# Altium footprint library aiskylab-01Resistors.PcbLib: 208 footprints (part 5 of 13)
Each footprint in its own frame and in the unit in brackets; x right, y up, seen from the top. Pads: shape width x height; smd on the part's side, far side on the other; paste and mask are expansions set on the pad; w line width, h text height; cw(c..) or ccw(c..) is an arc to the next point about the centre after c.
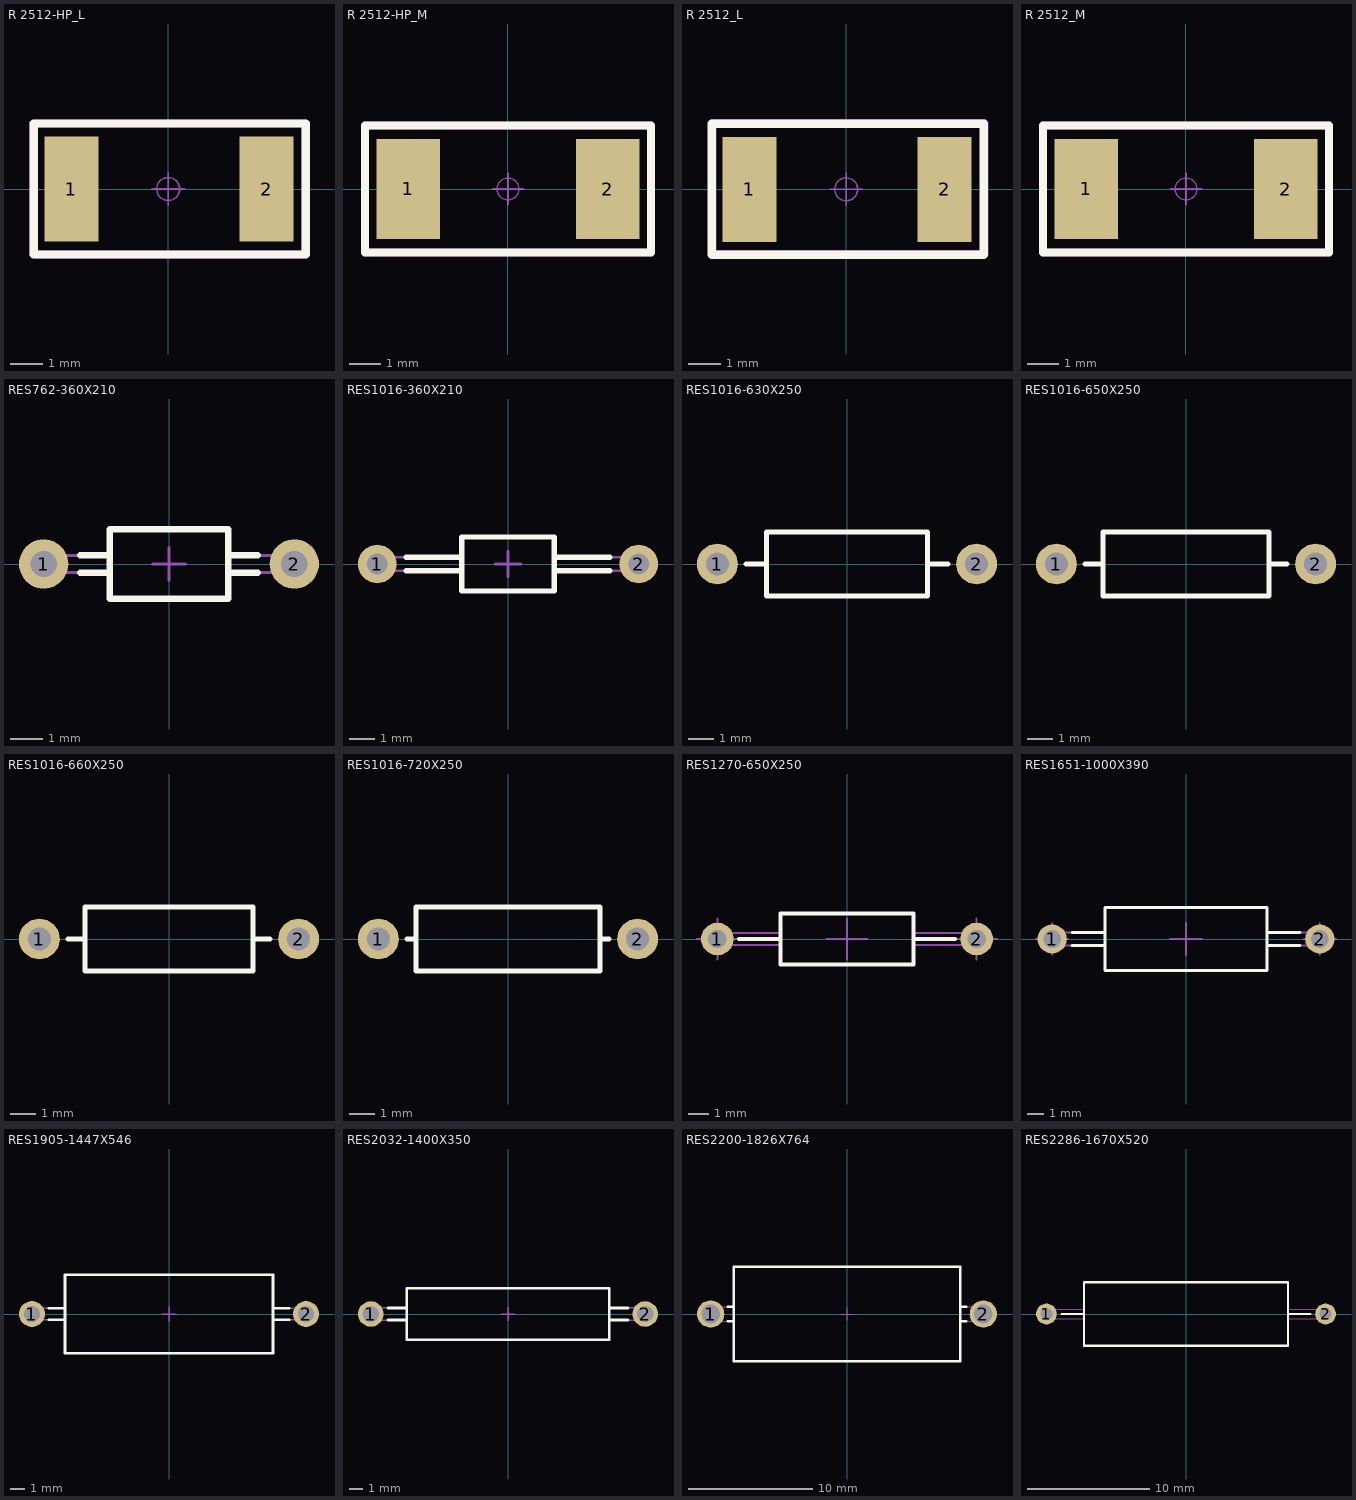
[diagram p4: the footprints below, top view; thin cyan lines are the x and y axes]

## R 2512-HP_L [mm] "2W贴片电阻"
pads (2):
  rect 1.65x3.2 smd: 1(-2.95,0) 2(3,0)
Top Overlay:
  lines w0.254: -4.1,-2 -4.1,2 4.2,2 4.2,-2 -4.1,-2
Top Designator:
  text ".Designator" at -7.568,-0.508 h1.52
Top Assembly:
  lines w0.254: -4.1,-2 -4.1,2 4.2,2 4.2,-2 -4.1,-2
Top Component Center:
  circle w0.05: c0,0 r0.35
  lines w0.05: -0.5,0 0.5,0 ; 0,-0.5 0,0.5
3D body "R 2512-HP.STEP": height 0.55, standoff -0.02, extent -3.2,-1.6 3.2,1.6

## R 2512-HP_M [mm] "2W贴片电阻"
pads (2):
  rect 2.032x3.2 smd: 1(-3.2,0) 2(3.2,0)
Top Overlay:
  lines w0.254: -4.572,-2.032 4.572,-2.032 4.572,2.032 -4.572,2.032 -4.572,-2.032
Top Designator:
  text ".Designator" at -7.618,-0.508 h1.52
Top Assembly:
  lines w0.254: -4.572,-2.032 4.572,-2.032 4.572,2.032 -4.572,2.032 -4.572,-2.032
Top Component Center:
  circle w0.05: c0,0 r0.35
  lines w0.05: -0.5,0 0.5,0 ; 0,-0.5 0,0.5
3D body "R 2512-HP.STEP": height 0.55, standoff -0.02, extent -3.2,-1.6 3.2,1.6

## R 2512_L [mm] "2W贴片电阻"
pads (2):
  rect 1.65x3.2 smd: 1(-2.95,0) 2(3,0)
Top Overlay:
  lines w0.254: -4.1,-2 -4.1,2 4.2,2 4.2,-2 -4.1,-2
Top Designator:
  text ".Designator" at -7.562,-0.498 h1.52
Top Assembly:
  lines w0.254: -4.089,-1.981 -4.089,2.019 4.211,2.019 4.211,-1.981 -4.089,-1.981
Top Component Center:
  circle w0.05: c0,0 r0.35
  lines w0.05: -0.5,0 0.5,0 ; 0,-0.5 0,0.5
3D body "R 2512.STEP": height 0.55, standoff -0.02, extent -3.2,-1.6 3.2,1.6

## R 2512_M [mm] "2W贴片电阻"
pads (2):
  rect 2.032x3.2 smd: 1(-3.2,0) 2(3.2,0)
Top Overlay:
  lines w0.254: -4.572,-2.032 4.572,-2.032 4.572,2.032 -4.572,2.032 -4.572,-2.032
Top Designator:
  text ".Designator" at -7.618,-0.508 h1.52
Top Assembly:
  lines w0.254: -4.572,-2.032 4.572,-2.032 4.572,2.032 -4.572,2.032 -4.572,-2.032
Top Component Center:
  circle w0.05: c0,0 r0.35
  lines w0.05: -0.5,0 0.5,0 ; 0,-0.5 0,0.5
3D body "R 2512.STEP": height 0.55, standoff -0.02, extent -3.2,-1.6 3.2,1.6

## RES762-360X210 [mm] "Resistor, Axial, Pad spacing 7.62mm - Body Lengh 3.6mm X Body Diameter 2.1mm"
height 2.1
pads (2):
  round 1.5 hole 0.8: 1(-3.81,0) 2(3.81,0)
Top Overlay:
  lines w0.2: -2.69,-0.26 -1.8,-0.26 ; -2.69,0.26 -1.8,0.26 ; 1.8,-0.26 2.69,-0.26 ; 1.8,0.26 2.69,0.26 ; -1.8,-1.05 1.8,-1.05 1.8,1.05 -1.8,1.05 -1.8,-1.05
Top Designator:
  text ".Designator" at -7.618,-0.508 h1.52
Top Assembly:
  lines w0.1: -1.8,-0.26 -3.81,-0.26 cw(c-3.81,0) -3.81,0.26 -1.8,0.26 ; 1.8,-0.26 3.81,-0.26 ccw(c3.81,0) 3.81,0.26 1.8,0.26 ; -1.8,-1.05 1.8,-1.05 1.8,1.05 -1.8,1.05 -1.8,-1.05
Top Dimensions:
  lines w0.1: -4.31,0 -3.81,0 ; -3.81,-0.5 -3.81,0 ; -3.81,0.5 -3.81,0 ; -3.31,0 -3.81,0 ; -0.5,0 0,0 ; 0,-0.5 0,0 ; 0,0.5 0,0 ; 0.5,0 0,0 ; 3.31,0 3.81,0 ; 3.81,-0.5 3.81,0 ; 3.81,0.5 3.81,0 ; 4.31,0 3.81,0
3D body "RES762-360X210.stp": height 2.1, standoff -3.6, extent -4.07,-1.05 4.07,1.05
3D body "v150-080.stp": height 0.02, standoff -1.65, extent 3.06,-0.75 4.56,0.75
3D body "v150-080.stp": height 0.02, standoff -1.65, extent -4.56,-0.75 -3.06,0.75

## RES1016-360X210 [mm] "Resistor, Axial, Pad spacing 10.16 mm - Body Lengh 3.6mm X Body Diameter 2.1mm"
height 2.1
pads (2):
  round 1.5 hole 0.8: 1(-5.08,0) 2(5.08,0)
Top Overlay:
  lines w0.2: -3.96,-0.26 -1.8,-0.26 ; -3.96,0.26 -1.8,0.26 ; 1.8,-0.26 3.96,-0.26 ; 1.8,0.26 3.96,0.26 ; -1.8,-1.05 1.8,-1.05 1.8,1.05 -1.8,1.05 -1.8,-1.05
Top Designator:
  text ".Designator" at -7.618,-0.508 h1.52
Top Assembly:
  lines w0.1: -1.8,-0.26 -5.08,-0.26 cw(c-5.08,0) -5.08,0.26 -1.8,0.26 ; 1.8,-0.26 5.08,-0.26 ccw(c5.08,0) 5.08,0.26 1.8,0.26 ; -1.8,-1.05 -1.8,1.05 1.8,1.05 1.8,-1.05 -1.8,-1.05
Top Dimensions:
  lines w0.1: -5.58,0 -5.08,0 ; -5.08,-0.5 -5.08,0 ; -5.08,0.5 -5.08,0 ; -4.58,0 -5.08,0 ; -0.5,0 0,0 ; 0,-0.5 0,0 ; 0,0.5 0,0 ; 0.5,0 0,0 ; 4.58,0 5.08,0 ; 5.08,-0.5 5.08,0 ; 5.08,0.5 5.08,0 ; 5.58,0 5.08,0
3D body "v150-080.stp": height 0.02, standoff -1.65, extent -5.83,-0.75 -4.33,0.75
3D body "v150-080.stp": height 0.02, standoff -1.65, extent 4.33,-0.75 5.83,0.75
3D body "RES1016-360X210.stp": height 2.1, standoff -3.6, extent -5.34,-1.05 5.34,1.05

## RES1016-630X250 [mm] "Resistor, Axial, Pad spacing 10.16 mm - Body Lengh 6.3mm X Body Diameter 2.5mm"
height 2.5
pads (2):
  round 1.6 hole 0.9: 1(-5.08,0) 2(5.08,0)
Top Overlay:
  lines w0.2: -3.95,0 -3.15,0 ; 3.15,0 3.95,0 ; -3.15,-1.25 -3.15,1.25 3.15,1.25 3.15,-1.25 -3.15,-1.25
Top Designator:
  text ".Designator" at -7.618,-0.508 h1.52
Top Assembly:
  lines w0.1: -3.95,0 -3.15,0 ; 3.15,0 3.95,0 ; -3.15,-1.25 -3.15,1.25 3.15,1.25 3.15,-1.25 -3.15,-1.25
3D body "v160-090.stp": height 0.02, standoff -1.65, extent -5.88,-0.8 -4.28,0.8
3D body "v160-090.stp": height 0.02, standoff -1.65, extent 4.28,-0.8 5.88,0.8
3D body "RES1016-630X250.stp": height 2.51, standoff -3.2, extent -5.38,-1.27 5.38,1.26

## RES1016-650X250 [mm] "Resistor, Axial, Pad spacing 10.16 mm - Body Lengh 6.5mm X Body Diameter 2.5mm"
height 2.5
pads (2):
  round 1.6 hole 0.9: 1(-5.08,0) 2(5.08,0)
Top Overlay:
  lines w0.2: -3.95,0 -3.25,0 ; 3.25,0 3.95,0 ; -3.25,-1.25 -3.25,1.25 3.25,1.25 3.25,-1.25 -3.25,-1.25
Top Designator:
  text ".Designator" at -7.618,-0.508 h1.52
Top Assembly:
  lines w0.1: -3.95,0 -3.25,0 ; 3.25,0 3.95,0 ; -3.25,-1.25 -3.25,1.25 3.25,1.25 3.25,-1.25 -3.25,-1.25
3D body "v160-090.stp": height 0.02, standoff -1.65, extent -5.88,-0.8 -4.28,0.8
3D body "v160-090.stp": height 0.02, standoff -1.65, extent 4.28,-0.8 5.88,0.8
3D body "RES1016-650X250.stp": height 2.51, standoff -3.2, extent -5.38,-1.27 5.38,1.26

## RES1016-660X250 [mm] "Resistor, Axial, Pad spacing 10.16 mm - Body Lengh 6.6mm X Body Diameter 2.5mm"
height 2.5
pads (2):
  round 1.6 hole 0.9: 1(-5.08,0) 2(5.08,0)
Top Overlay:
  lines w0.2: -3.95,0 -3.3,0 ; 3.3,0 3.95,0 ; -3.3,-1.25 -3.3,1.25 3.3,1.25 3.3,-1.25 -3.3,-1.25
Top Designator:
  text ".Designator" at -7.618,-0.508 h1.52
Top Assembly:
  lines w0.1: -3.95,0 -3.3,0 ; 3.3,0 3.95,0 ; -3.3,-1.25 -3.3,1.25 3.3,1.25 3.3,-1.25 -3.3,-1.25
3D body "v160-090.stp": height 0.02, standoff -1.65, extent -5.88,-0.8 -4.28,0.8
3D body "v160-090.stp": height 0.02, standoff -1.65, extent 4.28,-0.8 5.88,0.8
3D body "RES1016-660X250.stp": height 2.5, standoff -3.1, extent -5.38,-1.25 5.38,1.25

## RES1016-720X250 [mm] "Resistor, Axial, Pad spacing 10.16 mm - Body Lengh 7.2mm X Body Diameter 2.5mm"
height 2.5
pads (2):
  round 1.6 hole 0.9: 1(-5.08,0) 2(5.08,0)
Top Overlay:
  lines w0.2: -3.95,0 -3.6,0 ; 3.6,0 3.95,0 ; -3.6,-1.25 -3.6,1.25 3.6,1.25 3.6,-1.25 -3.6,-1.25
Top Designator:
  text ".Designator" at -7.618,-0.508 h1.52
Top Assembly:
  lines w0.1: -3.95,0 -3.6,0 ; 3.6,0 3.95,0 ; -3.6,-1.25 -3.6,1.25 3.6,1.25 3.6,-1.25 -3.6,-1.25
3D body "v160-090.stp": height 0.02, standoff -1.65, extent -5.88,-0.8 -4.28,0.8
3D body "v160-090.stp": height 0.02, standoff -1.65, extent 4.28,-0.8 5.88,0.8
3D body "RES1016-720X250.stp": height 2.5, standoff -3.2, extent -5.38,-1.25 5.38,1.25

## RES1270-650X250 [mm] "Resistor, Axial, Pad spacing 10.16 mm - Body Lengh 6.6mm X Body Diameter 2.5mm"
height 2.5
pads (2):
  round 1.6 hole 0.9: 1(-6.35,0) 2(6.35,0)
Top Overlay:
  lines w0.2: -5.292,0 -3.25,0 ; 3.25,0 5.292,0 ; -3.25,-1.25 3.25,-1.25 3.25,1.25 -3.25,1.25 -3.25,-1.25
Top Designator:
  text ".Designator" at -7.618,-0.508 h1.52
Top Assembly:
  lines w0.1: -3.25,-0.3 -6.336,-0.3 cw(c-6.35,0) -6.343,0.3 -3.25,0.3 ; 3.25,-0.3 6.35,-0.3 ccw(c6.35,0) 6.35,0.3 3.25,0.3 ; -3.25,-1.25 -3.25,1.25 3.25,1.25 3.25,-1.25 -3.25,-1.25
Top Dimensions:
  lines w0.1: -7.35,0 -6.35,0 ; -6.35,-1 -6.35,0 ; -6.35,1 -6.35,0 ; -5.35,0 -6.35,0 ; -1,0 0,0 ; 0,-1 0,0 ; 0,1 0,0 ; 1,0 0,0 ; 5.35,0 6.35,0 ; 6.35,-1 6.35,0 ; 6.35,1 6.35,0 ; 7.35,0 6.35,0
3D body "v160-090.stp": height 0.02, standoff -1.65, extent -7.15,-0.8 -5.55,0.8
3D body "v160-090.stp": height 0.02, standoff -1.65, extent 5.55,-0.8 7.15,0.8
3D body "RES1270-650X250.stp": height 2.5, standoff -3.6, extent -6.65,-1.25 6.65,1.25

## RES1651-1000X390 [mm] "Resistor, Axial, Pad spacing 16.51mm - Body Lengh 10mm X Body Diameter 3.9mm"
height 3.9
pads (2):
  round 1.8 hole 1.1: 1(-8.255,0) 2(8.255,0)
Top Overlay:
  lines w0.2: -7.018,-0.4 -5,-0.4 ; -7.018,0.4 -5,0.4 ; 5,-0.4 7.018,-0.4 ; 5,0.4 7.018,0.4 ; -5,-1.95 -5,1.95 ; -5,-1.95 5,-1.95 ; -5,-1.95 5,-1.95 ; -5,-1.95 -5,1.95 ; -5,1.95 5,1.95 ; -5,1.95 5,1.95 ; 5,-1.95 5,1.95 ; 5,-1.95 5,1.95
Top Designator:
  text ".Designator" at -7.618,-0.508 h1.52
Top Assembly:
  lines w0.1: -5,-0.4 -8.255,-0.4 cw(c-8.255,0) -8.255,0.4 -5,0.4 ; 5,-0.4 8.255,-0.4 ccw(c8.255,0) 8.255,0.4 5,0.4 ; -5,-1.95 -5,1.95 5,1.95 5,-1.95 -5,-1.95
Top Component Center:
  lines w0.1: -9.255,0 -8.255,0 ; -8.255,-1 -8.255,0 ; -8.255,1 -8.255,0 ; -7.255,0 -8.255,0 ; -1,0 0,0 ; 0,-1 0,0 ; 0,1 0,0 ; 1,0 0,0 ; 7.255,0 8.255,0 ; 8.255,-1 8.255,0 ; 8.255,1 8.255,0 ; 9.255,0 8.255,0
3D body "v200-130.stp": height 0.02, standoff -1.65, extent 7.255,-1 9.255,1
3D body "v200-130.stp": height 0.02, standoff -1.65, extent -9.255,-1 -7.255,1
3D body "RES1651-1000X390.stp": height 3.9, standoff -3.8, extent -8.645,-1.95 8.645,1.95

## RES1905-1447X546 [mm] "Resistor, Axial, Pad spacing 19.05mm - Body Lengh 14.22mm X Body Diameter 5.21mm"
height 5.46
pads (2):
  round 1.8 hole 1.1: 1(-9.525,0) 2(9.525,0)
Top Overlay:
  lines w0.2: -8.341,-0.4 -7.235,-0.4 ; -8.341,0.4 -7.235,0.4 ; 7.235,-0.4 8.341,-0.4 ; 7.235,0.4 8.341,0.4 ; -7.235,-2.73 -7.235,2.73 7.235,2.73 7.235,-2.73 -7.235,-2.73
Top Designator:
  text ".Designator" at -7.618,-0.508 h1.52
Top Assembly:
  lines w0.1: -7.235,-0.4 -9.525,-0.4 cw(c-9.525,0) -9.525,0.4 -7.235,0.4 ; 7.235,-0.4 9.525,-0.4 ccw(c9.525,0) 9.525,0.4 7.235,0.4 ; -7.235,-2.73 -7.235,2.73 7.235,2.73 7.235,-2.73 -7.235,-2.73
Top Dimensions:
  lines w0.1: -10.025,0 -9.525,0 ; -9.525,-0.5 -9.525,0 ; -9.525,0.5 -9.525,0 ; -9.025,0 -9.525,0 ; -0.5,0 0,0 ; 0,-0.5 0,0 ; 0,0.5 0,0 ; 0.5,0 0,0 ; 9.025,0 9.525,0 ; 9.525,-0.5 9.525,0 ; 9.525,0.5 9.525,0 ; 10.025,0 9.525,0
3D body "v200-130.stp": height 0.02, standoff -1.65, extent 8.525,-1 10.525,1
3D body "v200-130.stp": height 0.02, standoff -1.65, extent -10.525,-1 -8.525,1
3D body "RES1905-1447X546.stp": height 5.46, standoff -3.6, extent -9.931,-2.73 9.932,2.73

## RES2032-1400X350 [mm] "Resistor, Axial, Pad spacing 20.32mm - Body Lengh 14mm X Body Diameter 3.5mm"
height 3.8
pads (2):
  round 1.9 hole 1.2: 1(-10.16,0) 2(10.16,0)
Top Overlay:
  lines w0.2: -8.887,-0.45 -7.5,-0.45 ; -8.887,0.45 -7.5,0.45 ; 7.5,-0.45 8.887,-0.45 ; 7.5,0.45 8.887,0.45 ; -7.5,-1.9 -7.5,1.9 7.5,1.9 7.5,-1.9 -7.5,-1.9
Top Designator:
  text ".Designator" at -7.618,-0.508 h1.52
Top Assembly:
  lines w0.1: -7.5,-0.45 -10.16,-0.45 cw(c-10.16,0) -10.16,0.45 -7.5,0.45 ; 7.5,-0.45 10.16,-0.45 ccw(c10.16,0) 10.16,0.45 7.5,0.45 ; -7.5,-1.9 -7.5,1.9 7.5,1.9 7.5,-1.9 -7.5,-1.9
Top Dimensions:
  lines w0.1: -10.66,0 -10.16,0 ; -10.16,-0.5 -10.16,0 ; -10.16,0.5 -10.16,0 ; -9.66,0 -10.16,0 ; -0.5,0 0,0 ; 0,-0.5 0,0 ; 0,0.5 0,0 ; 0.5,0 0,0 ; 9.66,0 10.16,0 ; 10.16,-0.5 10.16,0 ; 10.16,0.5 10.16,0 ; 10.66,0 10.16,0
3D body "v200-130.stp": height 0.02, standoff -1.65, extent -11.16,-1 -9.16,1
3D body "v200-130.stp": height 0.02, standoff -1.65, extent 9.16,-1 11.16,1
3D body "RES2032-1400X350.stp": height 3.8, standoff -3.6, extent -10.61,-1.9 10.61,1.9

## RES2200-1826X764 [mm] "Resistor, Axial, Pad spacing 22mm - Body Lengh 18.26mm X Body Diameter 7.64mm"
height 7.64
pads (2):
  round 2.2 hole 1.5: 1(-11,0) 2(11,0)
Top Overlay:
  lines w0.2: -9.625,-0.6 -9.13,-0.6 ; -9.625,0.6 -9.13,0.6 ; 9.13,-0.6 9.625,-0.6 ; 9.13,0.6 9.625,0.6 ; -9.13,-3.82 9.13,-3.82 9.13,3.82 -9.13,3.82 -9.13,-3.82
Top Designator:
  text ".Designator" at -7.618,-0.508 h1.52
Top Assembly:
  lines w0.1: -9.13,-3.82 -9.13,3.82 9.13,3.82 9.13,-3.82 -9.13,-3.82
Top Dimensions:
  lines w0.1: -11.5,0 -11,0 ; -11,-0.5 -11,0 ; -11,0.5 -11,0 ; -10.5,0 -11,0 ; -0.5,0 0,0 ; 0,-0.5 0,0 ; 0,0.5 0,0 ; 0.5,0 0,0 ; 10.5,0 11,0 ; 11,-0.5 11,0 ; 11,0.5 11,0 ; 11.5,0 11,0
Bottom 3D Body:
  lines w0.1: -9.13,-0.6 -11,-0.6 cw(c-11,0) -11,0.6 -9.13,0.6 ; 9.13,-0.6 11,-0.6 ccw(c11,0) 11,0.6 9.13,0.6
3D body "v200-130.stp": height 0.02, standoff -1.65, extent -12,-1 -10,1
3D body "v200-130.stp": height 0.02, standoff -1.65, extent 10,-1 12,1
3D body "RES2200-1826X764.stp": height 7.65, standoff -3.6, extent -11.6,-3.82 11.6,3.82

## RES2286-1670X520 [mm] "Resistor, Axial, Pad spacing 22.22 mm - Body Lengh 16.7mm X Body Diameter 5.2mm"
height 5.2
pads (2):
  round 1.7 hole 1: 1(-11.43,0) 2(11.43,0)
Top Overlay:
  lines w0.2: -10.16,0 -8.35,0 ; 8.35,0 10.16,0 ; -8.35,-2.6 8.35,-2.6 8.35,2.6 -8.35,2.6 -8.35,-2.6
Top Designator:
  text ".Designator" at -7.617,-0.508 h1.52
Top Assembly:
  lines w0.1: -11.43,-0.4 -8.35,-0.4 ; -11.43,0.4 -8.35,0.4 ; 8.35,-0.4 11.43,-0.4 ; 8.35,0.4 11.43,0.4 ; -8.35,-2.6 -8.35,2.6 8.35,2.6 8.35,-2.6 -8.35,-2.6
3D body "v200-130.stp": height 0.02, standoff -1.65, extent -12.43,-1 -10.43,1
3D body "v200-130.stp": height 0.02, standoff -1.65, extent 10.43,-1 12.43,1
3D body "RES2286-1670X520.stp": height 5.2, standoff -3.6, extent -11.82,-2.6 11.82,2.6